# Altium footprint library 1.03-电容.PcbLib: 224 footprints (part 12 of 14)
Each footprint in its own frame and in the unit in brackets; x right, y up, seen from the top. Pads: shape width x height; smd on the part's side, far side on the other; paste and mask are expansions set on the pad; w line width, h text height; cw(c..) or ccw(c..) is an arc to the next point about the centre after c.
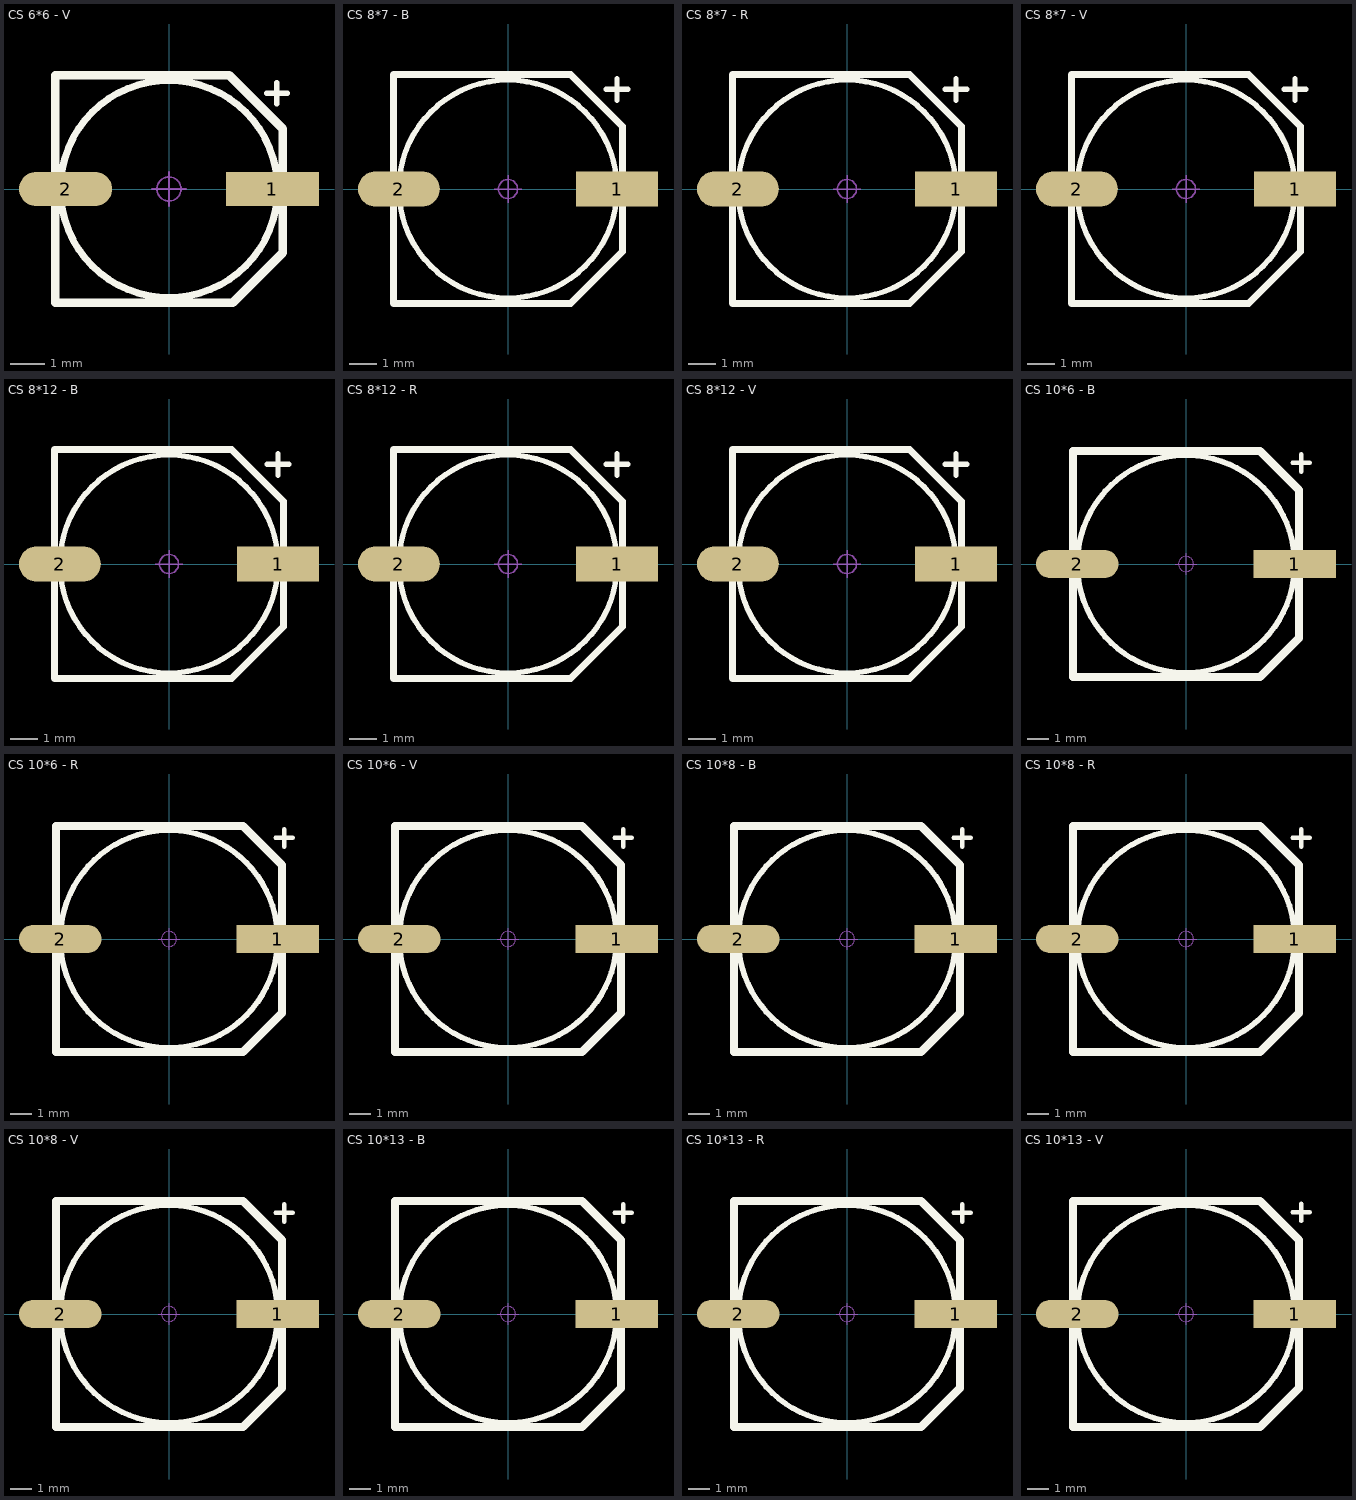
[diagram p11: the footprints below, top view; thin cyan lines are the x and y axes]

## CS 6*6 - V [mm] "直径6mm，高6mm                 联系卖家 免费查找封装"
pads (2):
  rect 2.7x1 smd: 1(3,0)
  oval 2.7x1 smd: 2(-3,0)
Top Overlay:
  circle w0.2: c0,0 r3.15
  lines w0.152: 2.829,2.775 3.429,2.775 ; 3.125,2.475 3.125,3.079
  lines w0.254: -3.3,-3.3 1.85,-3.3 3.3,-1.85 3.3,1.75 1.75,3.3 -3.3,3.3 -3.3,-3.3
Mechanical 15:
  circle w0.05: c0,0 r0.35
  lines w0.05: -0.5,0 0.5,0 ; 0,-0.5 0,0.5
3D body "CS_SMD_6x6-P.STEP": height 6.05, standoff 0.04, extent -3.5,-3.15 3.5,3.15

## CS 8*7 - B [mm] "直径8mm，高7mm            联系卖家 免费查找封装"
pads (2):
  rect 3x1.3 smd: 1(4,0)
  oval 3x1.3 smd: 2(-4,0)
Top Overlay:
  circle w0.2: c0,0 r4
  lines w0.2: 3.6,3.65 4.4,3.65 ; 3.996,3.25 3.996,4.05
  lines w0.254: -4.2,-4.2 2.3,-4.2 4.2,-2.3 4.2,2.3 2.3,4.2 -4.2,4.2 -4.2,-4.2
Mechanical 15:
  circle w0.05: c0,0 r0.35
  lines w0.05: -0.5,0 0.5,0 ; 0,-0.5 0,0.5
3D body "CS_SMD_8x7-B.STEP": height 7.05, standoff 0.04, extent -4.5,-4.15 4.5,4.15

## CS 8*7 - R [mm] "直径8mm，高7mm            联系卖家 免费查找封装"
pads (2):
  rect 3x1.3 smd: 1(4,0)
  oval 3x1.3 smd: 2(-4,0)
Top Overlay:
  circle w0.2: c0,0 r4
  lines w0.2: 3.6,3.65 4.4,3.65 ; 3.996,3.25 3.996,4.05
  lines w0.254: -4.2,-4.2 -4.2,4.2 2.3,4.2 4.2,2.3 4.2,-2.3 2.3,-4.2 -4.2,-4.2
Mechanical 15:
  circle w0.05: c0,0 r0.35
  lines w0.05: -0.5,0 0.5,0 ; 0,-0.5 0,0.5
3D body "CS_SMD_8x7-R.STEP": height 7.05, standoff 0.04, extent -4.5,-4.15 4.5,4.15

## CS 8*7 - V [mm] "直径8mm，高7mm"
pads (2):
  rect 3x1.3 smd: 1(4,0)
  oval 3x1.3 smd: 2(-4,0)
Top Overlay:
  circle w0.2: c0,0 r4
  lines w0.2: 3.6,3.65 4.4,3.65 ; 3.996,3.25 3.996,4.05
  lines w0.254: -4.2,-4.2 2.3,-4.2 4.2,-2.3 4.2,2.3 2.3,4.2 -4.2,4.2 -4.2,-4.2
Mechanical 15:
  circle w0.05: c0,0 r0.35
  lines w0.05: -0.5,0 0.5,0 ; 0,-0.5 0,0.5
3D body "CS_SMD_8x7-P.STEP": height 7.05, standoff 0.04, extent -4.5,-4.15 4.5,4.15

## CS 8*12 - B [mm] "直径8mm，高12mm            联系卖家 免费查找封装"
pads (2):
  rect 3x1.3 smd: 1(4,0)
  oval 3x1.3 smd: 2(-4,0)
Top Overlay:
  circle w0.2: c0,0 r4
  lines w0.2: 3.6,3.65 4.4,3.65 ; 3.996,3.25 3.996,4.05
  lines w0.254: -4.2,-4.2 -4.2,4.2 2.3,4.2 4.2,2.3 4.2,-2.3 2.3,-4.2 -4.2,-4.2
Mechanical 15:
  circle w0.05: c0,0 r0.35
  lines w0.05: -0.5,0 0.5,0 ; 0,-0.5 0,0.5
3D body "CS_SMD_8x12-B.STEP": height 12.05, standoff 0.04, extent -4.5,-4.15 4.5,4.15

## CS 8*12 - R [mm] "直径8mm，高12mm"
pads (2):
  rect 3x1.3 smd: 1(4,0)
  oval 3x1.3 smd: 2(-4,0)
Top Overlay:
  circle w0.2: c0,0 r4
  lines w0.2: 3.6,3.65 4.4,3.65 ; 3.996,3.25 3.996,4.05
  lines w0.254: -4.2,-4.2 -4.2,4.2 2.3,4.2 4.2,2.3 4.2,-2.3 2.3,-4.2 -4.2,-4.2
Mechanical 15:
  circle w0.05: c0,0 r0.35
  lines w0.05: -0.5,0 0.5,0 ; 0,-0.5 0,0.5
3D body "CS_SMD_8x12-R.STEP": height 12.05, standoff 0.04, extent -4.5,-4.15 4.5,4.15

## CS 8*12 - V [mm] "直径8mm，高12mm               联系卖家 免费查找封装"
pads (2):
  rect 3x1.3 smd: 1(4,0)
  oval 3x1.3 smd: 2(-4,0)
Top Overlay:
  circle w0.2: c0,0 r4
  lines w0.2: 3.6,3.65 4.4,3.65 ; 3.996,3.25 3.996,4.05
  lines w0.254: -4.2,-4.2 -4.2,4.2 2.3,4.2 4.2,2.3 4.2,-2.3 2.3,-4.2 -4.2,-4.2
Mechanical 15:
  circle w0.05: c0,0 r0.35
  lines w0.05: -0.5,0 0.5,0 ; 0,-0.5 0,0.5
3D body "CS_SMD_8x12-P.STEP": height 12.05, standoff 0.04, extent -4.5,-4.15 4.5,4.15

## CS 10*6 - B [mm] "直径10mm，高6mm"
pads (2):
  rect 3.8x1.3 smd: 1(5,0)
  oval 3.8x1.3 smd: 2(-5,0)
Top Overlay:
  circle w0.254: c0,0 r5
  lines w0.2: 4.9,4.65 5.7,4.65 ; 5.296,4.25 5.296,5.05
  lines w0.381: 5.191,-3.413 3.404,-5.2 -5.2,-5.2 -5.2,5.2 3.404,5.2 5.2,3.404 5.2,-3.404
Mechanical 15:
  circle w0.05: c0,0 r0.35
  lines w0.05: -0.5,0 0.5,0 ; 0,-0.5 0,0.5
3D body "CS_SMD_10x6-B.STEP": height 6.05, standoff 0.04, extent -5.8,-5.15 5.8,5.15

## CS 10*6 - R [mm] "直径10mm，高6mm"
pads (2):
  rect 3.8x1.3 smd: 1(5,0)
  oval 3.8x1.3 smd: 2(-5,0)
Top Overlay:
  circle w0.254: c0,0 r5
  lines w0.2: 4.9,4.65 5.7,4.65 ; 5.296,4.25 5.296,5.05
  lines w0.381: 5.191,-3.413 3.404,-5.2 -5.2,-5.2 -5.2,5.2 3.404,5.2 5.2,3.404 5.2,-3.404
Mechanical 15:
  circle w0.05: c0,0 r0.35
  lines w0.05: -0.5,0 0.5,0 ; 0,-0.5 0,0.5
3D body "CS_SMD_10x6-R.STEP": height 6.05, standoff 0.04, extent -5.8,-5.15 5.8,5.15

## CS 10*6 - V [mm] "直径10mm，高6mm               联系卖家 免费查找封装"
pads (2):
  rect 3.8x1.3 smd: 1(5,0)
  oval 3.8x1.3 smd: 2(-5,0)
Top Overlay:
  circle w0.254: c0,0 r5
  lines w0.2: 4.9,4.65 5.7,4.65 ; 5.296,4.25 5.296,5.05
  lines w0.381: 5.191,-3.413 3.404,-5.2 -5.2,-5.2 -5.2,5.2 3.404,5.2 5.2,3.404 5.2,-3.404
Mechanical 15:
  circle w0.05: c0,0 r0.35
  lines w0.05: -0.5,0 0.5,0 ; 0,-0.5 0,0.5
3D body "CS_SMD_10x6-P.STEP": height 6.05, standoff 0.04, extent -5.8,-5.15 5.8,5.15

## CS 10*8 - B [mm] "直径10mm，高8mm"
pads (2):
  rect 3.8x1.3 smd: 1(5,0)
  oval 3.8x1.3 smd: 2(-5,0)
Top Overlay:
  circle w0.254: c0,0 r5
  lines w0.2: 4.9,4.65 5.7,4.65 ; 5.296,4.25 5.296,5.05
  lines w0.381: 5.191,-3.413 3.404,-5.2 -5.2,-5.2 -5.2,5.2 3.404,5.2 5.2,3.404 5.2,-3.404
Mechanical 15:
  circle w0.05: c0,0 r0.35
  lines w0.05: -0.5,0 0.5,0 ; 0,-0.5 0,0.5
3D body "CS_SMD_10x8-B.STEP": height 8.05, standoff 0.04, extent -5.8,-5.15 5.8,5.15

## CS 10*8 - R [mm] "直径10mm，高8mm"
pads (2):
  rect 3.8x1.3 smd: 1(5,0)
  oval 3.8x1.3 smd: 2(-5,0)
Top Overlay:
  circle w0.254: c0,0 r5
  lines w0.2: 4.9,4.65 5.7,4.65 ; 5.296,4.25 5.296,5.05
  lines w0.381: 5.191,-3.413 3.404,-5.2 -5.2,-5.2 -5.2,5.2 3.404,5.2 5.2,3.404 5.2,-3.404
Mechanical 15:
  circle w0.05: c0,0 r0.35
  lines w0.05: -0.5,0 0.5,0 ; 0,-0.5 0,0.5
3D body "CS_SMD_10x8-R.STEP": height 8.05, standoff 0.04, extent -5.8,-5.15 5.8,5.15

## CS 10*8 - V [mm] "直径10mm，高8mm"
pads (2):
  rect 3.8x1.3 smd: 1(5,0)
  oval 3.8x1.3 smd: 2(-5,0)
Top Overlay:
  circle w0.254: c0,0 r5
  lines w0.2: 4.9,4.65 5.7,4.65 ; 5.296,4.25 5.296,5.05
  lines w0.381: 5.191,-3.413 3.404,-5.2 -5.2,-5.2 -5.2,5.2 3.404,5.2 5.2,3.404 5.2,-3.404
Mechanical 15:
  circle w0.05: c0,0 r0.35
  lines w0.05: -0.5,0 0.5,0 ; 0,-0.5 0,0.5
3D body "CS_SMD_10x8-P.STEP": height 8.05, standoff 0.04, extent -5.8,-5.15 5.8,5.15

## CS 10*13 - B [mm] "直径10mm，高13mm                 联系卖家 免费查找封装"
pads (2):
  rect 3.8x1.3 smd: 1(5,0)
  oval 3.8x1.3 smd: 2(-5,0)
Top Overlay:
  circle w0.254: c0,0 r5
  lines w0.2: 4.9,4.65 5.7,4.65 ; 5.296,4.25 5.296,5.05
  lines w0.381: 5.191,-3.413 3.404,-5.2 -5.2,-5.2 -5.2,5.2 3.404,5.2 5.2,3.404 5.2,-3.404
Mechanical 15:
  circle w0.05: c0,0 r0.35
  lines w0.05: -0.5,0 0.5,0 ; 0,-0.5 0,0.5
3D body "CS_SMD_10x13-B.STEP": height 13.05, standoff 0.04, extent -5.8,-5.15 5.8,5.15

## CS 10*13 - R [mm] "直径10mm，高13mm                 联系卖家 免费查找封装"
pads (2):
  rect 3.8x1.3 smd: 1(5,0)
  oval 3.8x1.3 smd: 2(-5,0)
Top Overlay:
  circle w0.254: c0,0 r5
  lines w0.2: 4.9,4.65 5.7,4.65 ; 5.296,4.25 5.296,5.05
  lines w0.381: 5.191,-3.413 3.404,-5.2 -5.2,-5.2 -5.2,5.2 3.404,5.2 5.2,3.404 5.2,-3.404
Mechanical 15:
  circle w0.05: c0,0 r0.35
  lines w0.05: -0.5,0 0.5,0 ; 0,-0.5 0,0.5
3D body "CS_SMD_10x13-R.STEP": height 13.05, standoff 0.04, extent -5.8,-5.15 5.8,5.15

## CS 10*13 - V [mm] "直径10mm，高13mm                 联系卖家 免费查找封装"
pads (2):
  rect 3.8x1.3 smd: 1(5,0)
  oval 3.8x1.3 smd: 2(-5,0)
Top Overlay:
  circle w0.254: c0,0 r5
  lines w0.2: 4.9,4.675 5.7,4.675 ; 5.296,4.275 5.296,5.075
  lines w0.381: 5.191,-3.413 3.404,-5.2 -5.2,-5.2 -5.2,5.2 3.404,5.2 5.2,3.404 5.2,-3.404
Mechanical 15:
  circle w0.05: c0,0 r0.35
  lines w0.05: -0.5,0 0.5,0 ; 0,-0.5 0,0.5
3D body "CS_SMD_10x13-P.STEP": height 13.05, standoff 0.04, extent -5.8,-5.15 5.8,5.15